# Altium footprint library Miscellaneous Devices LC.PcbLib: 733 footprints (part 13 of 46)
Each footprint in its own frame and in the unit in brackets; x right, y up, seen from the top. Pads: shape width x height; smd on the part's side, far side on the other; paste and mask are expansions set on the pad; w line width, h text height; cw(c..) or ccw(c..) is an arc to the next point about the centre after c.
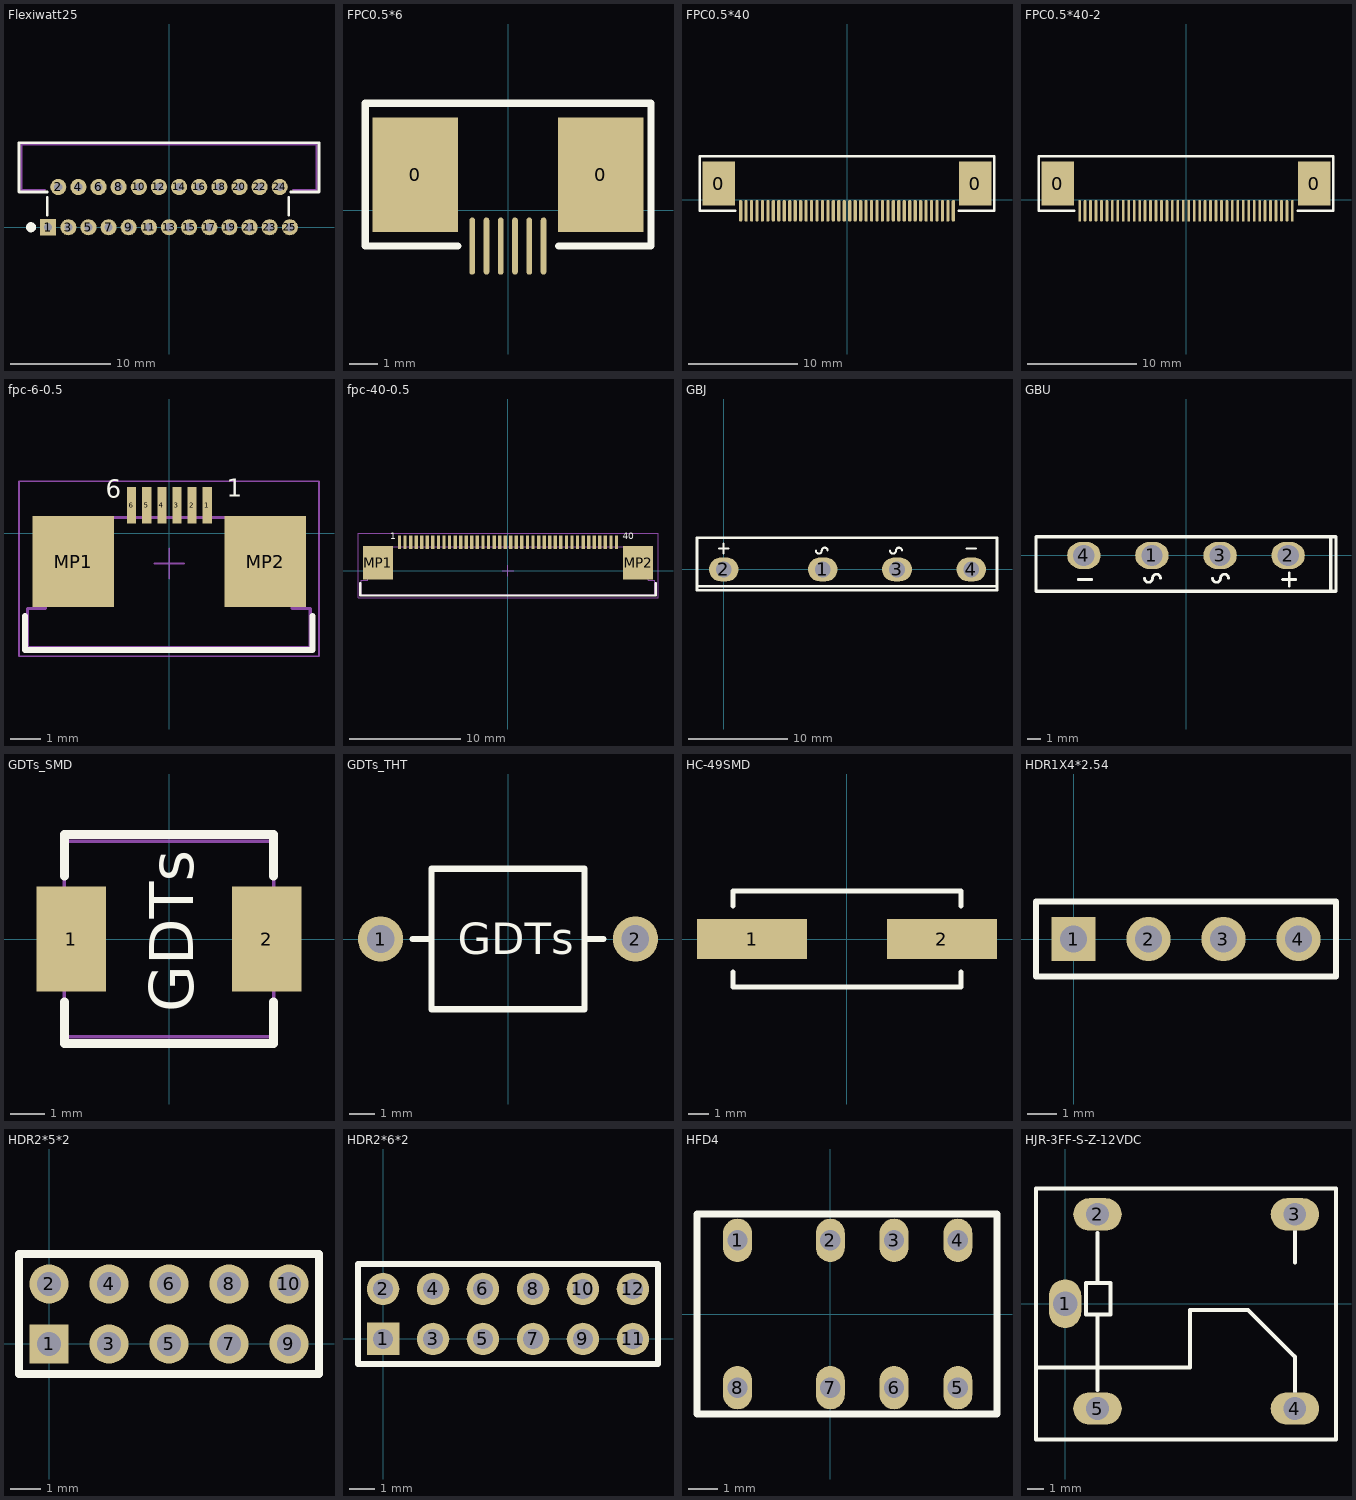
[diagram p12: the footprints below, top view; thin cyan lines are the x and y axes]

## Flexiwatt25 [mm] "Stepping Motor Driver IC"
pads (25):
  rect 1.6x1.6 hole 0.8: 1(-12,0)
  round 1.6 hole 0.8: 2(-11,4) 3(-10,0) 4(-9,4) 5(-8,0) 6(-7,4) 7(-6,0) 8(-5,4) 9(-4,0) 10(-3,4) 11(-2,0) 12(-1,4) 13(0,0) 14(1,4) 15(2,0) 16(3,4) 17(4,0) 18(5,4) 19(6,0) 20(7,4) 21(8,0) 22(9,4) 23(10,0) 24(11,4) 25(12,0)
Top Overlay:
  circle w0.5: c-13.7,0 r0.25
  lines w0.254: -12.1,1.2 -12.1,3 ; -12.1,3.5 -14.9,3.5 -14.9,8.4 14.9,8.4 14.9,3.5 12.1,3.5 ; 11.9,1.2 11.9,3
Mechanical 13:
  lines w0.2: -12.3,3.7 -14.65,3.7 -14.65,8.2 14.65,8.2 14.65,3.7 12.3,3.7

## FPC0.5*6 [mm]
pads (8):
  rect 3x4 smd: 0(-3.255,1.25) 0(3.255,1.25)
  oval 0.2x2 smd: 1(-1.255,-1.25) 2(-0.755,-1.25) 3(-0.255,-1.25) 4(0.245,-1.25) 5(0.745,-1.25) 6(1.245,-1.25)
Top Overlay:
  lines w0.254: -1.755,-1.25 -5.005,-1.25 -5.005,3.75 -1.255,3.75 5.013,3.75 5.013,-1.25 1.778,-1.25

## FPC0.5*40 [mm]
pads (42):
  rect 3x4 smd: 0(-11.75,1.5) 0(11.75,1.5)
  oval 0.3x2 smd: 1(-9.75,-1) 2(-9.25,-1) 3(-8.75,-1) 4(-8.25,-1) 5(-7.75,-1) 6(-7.25,-1) 7(-6.75,-1) 8(-6.25,-1) 9(-5.75,-1) 10(-5.25,-1) 11(-4.75,-1) 12(-4.25,-1) 13(-3.75,-1) 14(-3.25,-1) 15(-2.75,-1) 16(-2.25,-1) 17(-1.75,-1) 18(-1.25,-1) 19(-0.75,-1) 20(-0.25,-1) 21(0.25,-1) 22(0.75,-1) 23(1.25,-1) 24(1.75,-1) 25(2.25,-1) 26(2.75,-1) 27(3.25,-1) 28(3.75,-1) 29(4.25,-1) 30(4.75,-1) 31(5.25,-1) 32(5.75,-1) 33(6.25,-1) 34(6.75,-1) 35(7.25,-1) 36(7.75,-1) 37(8.25,-1) 38(8.75,-1) 39(9.25,-1) 40(9.75,-1)
Top Overlay:
  lines w0.254: -10.25,-1 -13.5,-1 -13.5,4 -9.75,4 13.5,4 13.5,-1 10.25,-1

## FPC0.5*40-2 [mm]
pads (42):
  rect 3x4 smd: 0(-11.75,1.5) 0(11.75,1.5)
  oval 0.254x2 smd: 1(9.75,-1) 2(9.25,-1) 3(8.75,-1) 4(8.25,-1) 5(7.75,-1) 6(7.25,-1) 7(6.75,-1) 8(6.25,-1) 9(5.75,-1) 10(5.25,-1) 11(4.75,-1) 12(4.25,-1) 13(3.75,-1) 14(3.25,-1) 15(2.75,-1) 16(2.25,-1) 17(1.75,-1) 18(1.25,-1) 19(0.75,-1) 20(0.25,-1) 21(-0.25,-1) 22(-0.75,-1) 23(-1.25,-1) 24(-1.75,-1) 25(-2.25,-1) 26(-2.75,-1) 27(-3.25,-1) 28(-3.75,-1) 29(-4.25,-1) 30(-4.75,-1) 31(-5.25,-1) 32(-5.75,-1) 33(-6.25,-1) 34(-6.75,-1) 35(-7.25,-1) 36(-7.75,-1) 37(-8.25,-1) 38(-8.75,-1) 39(-9.25,-1) 40(-9.75,-1)
Top Overlay:
  lines w0.254: -10.25,-1 -13.5,-1 -13.5,4 -9.75,4 13.5,4 13.5,-1 10.25,-1

## fpc-6-0.5 [mm] "ZIF Connectors, Horizontal, Top Contact, pitch 0.5mm, 40p"
height 2.25
pads (8):
  rect 0.3x1.2 smd: 1(1.257,0.93) 2(0.757,0.93) 3(0.257,0.93) 4(-0.243,0.93) 5(-0.743,0.93) 6(-1.243,0.93)
  rect 2.7x3 smd: MP1(-3.173,-0.93) MP2(3.173,-0.93)
Top Overlay:
  lines w0.2: -4.768,-2.73 -4.768,-3.855 4.739,-3.855 4.739,-2.73
  text "6" at -2.093,0.98 h1.02
  text "1" at 1.905,1.016 h1.02
Mechanical 13:
  lines w0.1: -4.693,-3.78 -4.693,-2.48 -4.093,-2.48 -4.093,0.52 4.064,0.52 4.064,-2.48 4.664,-2.48 4.664,-3.78 -4.693,-3.78
Mechanical 15:
  lines w0.05: -0.502,-0.995 0.498,-0.995 ; -0.002,-1.495 -0.002,-0.495 ; -4.968,-4.055 4.953,-4.055 4.953,1.73 -4.968,1.73 -4.968,-4.055

## fpc-40-0.5 [mm] "ZIF Connectors, Horizontal, Top Contact, pitch 0.5mm, 40p"
height 2.25
pads (42):
  rect 0.3x1.2 smd: 1(-9.75,2.56) 2(-9.25,2.56) 3(-8.75,2.56) 4(-8.25,2.56) 5(-7.75,2.56) 6(-7.25,2.56) 7(-6.75,2.56) 8(-6.25,2.56) 9(-5.75,2.56) 10(-5.25,2.56) 11(-4.75,2.56) 12(-4.25,2.56) 13(-3.75,2.56) 14(-3.25,2.56) 15(-2.75,2.56) 16(-2.25,2.56) 17(-1.75,2.56) 18(-1.25,2.56) 19(-0.75,2.56) 20(-0.25,2.56) 21(0.25,2.56) 22(0.75,2.56) 23(1.25,2.56) 24(1.75,2.56) 25(2.25,2.56) 26(2.75,2.56) 27(3.25,2.56) 28(3.75,2.56) 29(4.25,2.56) 30(4.75,2.56) 31(5.25,2.56) 32(5.75,2.56) 33(6.25,2.56) 34(6.75,2.56) 35(7.25,2.56) 36(7.75,2.56) 37(8.25,2.56) 38(8.75,2.56) 39(9.25,2.56) 40(9.75,2.56)
  rect 2.7x3 smd: MP1(-11.68,0.7) MP2(11.68,0.7)
Top Overlay:
  lines w0.2: -13.275,-1.1 -13.275,-2.225 13.275,-2.225 13.275,-1.1
  text "40" at 10.3,2.61 h1.02
  text "1" at -10.6,2.61 h1.02
Mechanical 13:
  lines w0.1: -13.2,-2.15 -13.2,-0.85 -12.6,-0.85 -12.6,2.15 12.6,2.15 12.6,-0.85 13.2,-0.85 13.2,-2.15 -13.2,-2.15
Mechanical 15:
  lines w0.05: -0.5,0 0.5,0 ; 0,-0.5 0,0.5 ; -13.475,-2.425 -13.475,3.36 13.475,3.36 13.475,-2.425 -13.475,-2.425
3D body "68714014022.stp": height 2.1, standoff 0, extent -13.2,-2.15 13.2,2.95

## GBJ [mm]
pads (4):
  oval 3x2.4 hole 1.6: 1(10,0) 2(0,0) 3(17.5,0) 4(25,0)
Top Overlay:
  lines w0.203: -0.5,2.1 0.5,2.1 ; 0,1.6 0,2.6 ; 9.3,1.9 ccw(c9.6,1.9) 9.9,1.9 cw(c10.2,1.9) 10.5,1.9 ; 16.8,1.9 ccw(c17.1,1.9) 17.4,1.9 cw(c17.7,1.9) 18,1.9 ; 24.5,2.1 25.5,2.1
  lines w0.254: -2.7,-1.7 27.6,-1.7 ; -2.7,-2.1 -2.7,3.2 27.6,3.2 27.6,-2.1 -2.7,-2.1

## GBU [mm]
pads (4):
  oval 2.5x2 hole 1.6: 1(-2.54,0) 2(7.62,0) 3(2.54,0) 4(-7.62,0)
Top Overlay:
  lines w0.203: -8.04,-1.8 -7.04,-1.8 ; -3.1,-1.7 ccw(c-2.8,-1.7) -2.5,-1.7 cw(c-2.2,-1.7) -1.9,-1.7 ; 1.98,-1.7 ccw(c2.28,-1.7) 2.58,-1.7 cw(c2.88,-1.7) 3.18,-1.7 ; 7.2,-1.8 8.2,-1.8 ; 7.7,-2.3 7.7,-1.3
  lines w0.254: 10.8,-2.67 10.8,1.3 ; -11.2,-2.67 11.2,-2.67 11.2,1.4 -11.2,1.4 -11.2,-2.67

## GDTs_SMD [mm]
pads (2):
  rect 2x3 smd: 1(-2.8,0) 2(2.8,0)
Top Overlay:
  lines w0.254: -3,-1.8 -3,-3 3,-3 3,-1.8 ; -3,1.8 -3,3 3,3 3,1.8
  text "GDTs" at 0.7,-2.1 h1.27
Mechanical 13:
  lines w0.1: -3,-2.8 3,-2.8 3,2.8 -3,2.8 -3,-2.8

## GDTs_THT [mm]
pads (2):
  round 1.8 hole 1.1: 1(-5.08,0) 2(5.08,0)
Top Overlay:
  lines w0.254: -3.8,0 -3.048,0 ; 3.048,0 3.8,0 ; -3.048,-2.794 3.048,-2.794 3.048,2.794 -3.048,2.794 -3.048,-2.794
  text "GDTs" at -2,-0.6 h1.27

## HC-49SMD [mm]
pads (2):
  rect 5.5x2 smd: 1(-4.75,0) 2(4.75,0)
Top Overlay:
  lines w0.254: -5.7,-1.65 -5.7,-2.4 5.7,-2.4 5.7,-1.65 ; -5.7,1.65 -5.7,2.4 5.7,2.4 5.7,1.65
3D body "User Library-hc49_cystal.STEP": height 4, standoff 0, extent -6.7,-2.462 6.7,2.438

## HDR1X4*2.54 [mm]
pads (4):
  rect 1.5x1.5 hole 0.9: 1(0,0)
  round 1.5 hole 0.9: 2(2.54,0) 3(5.08,0) 4(7.62,0)
Top Overlay:
  lines w0.2: -1.27,-1.27 -1.27,1.27 8.89,1.27 8.89,-1.27 -1.27,-1.27

## HDR2*5*2 [mm]
pads (10):
  rect 1.3x1.3 hole 0.8: 1(0,0)
  round 1.3 hole 0.8: 2(0,2) 3(2,0) 4(2,2) 5(4,0) 6(4,2) 7(6,0) 8(6,2) 9(8,0) 10(8,2)
Top Overlay:
  lines w0.254: 9,2.983 9,-1 -1,-1 -1,3 9,3

## HDR2*6*2 [mm]
pads (12):
  rect 1.3x1.3 hole 0.8: 1(0,0)
  round 1.3 hole 0.8: 2(0,2) 3(2,0) 4(2,2) 5(4,0) 6(4,2) 7(6,0) 8(6,2) 9(8,0) 10(8,2) 11(10,0) 12(10,2)
Top Overlay:
  lines w0.254: -1,-1 11,-1 11,3 -1,3 -1,-1

## HFD4 [mm] "磁保持继电器"
pads (8):
  oval 1x1.5 hole 0.7: 1(-3.2,2.54) 2(0,2.54) 3(2.2,2.54) 4(4.4,2.54) 5(4.4,-2.54) 6(2.2,-2.54) 7(0,-2.54) 8(-3.2,-2.54)
Top Overlay:
  lines w0.254: -4.6,-3.45 -4.6,3.45 5.75,3.45 5.75,-3.45 -4.6,-3.45

## HJR-3FF-S-Z-12VDC [mm]
pads (5):
  oval 2x3 hole 1.5: 1(0,0)
  oval 3x2 hole 1.4: 2(2.002,5.523) 3(14.202,5.523) 4(14.202,-6.477) 5(2.002,-6.477)
Top Overlay:
  lines w0.254: -1.8,-1.524 -1.8,-3.937 7.725,-3.937 7.725,-0.381 11.027,-0.381 11.303,-0.381 14.202,-3.28 14.202,-5.715 ; 2.01,-5.326 2.01,-0.677 ; 2.01,1.27 2.01,4.372 ; 14.202,2.54 14.202,4.699 ; -1.798,-8.382 16.742,-8.382 16.742,7.112 -1.798,7.112 -1.798,-8.382 ; 1.302,-0.677 2.802,-0.677 2.802,1.27 2.427,1.27 1.677,1.27 1.302,1.27 1.302,-0.677